# Altium footprint library SEMICONDUCTORS.PcbLib: 91 footprints (part 5 of 6) (continued)
## TFBGA-441 [mm] (continued)
3D body: height 0.37, standoff -0.03, extent 1.406,-7.396 1.805,-7.002
3D body: height 0.37, standoff -0.03, extent 1.407,-8.196 1.806,-7.802
3D body: height 0.37, standoff -0.03, extent 2.21,-8.996 2.609,-8.602
3D body: height 0.37, standoff -0.03, extent 2.206,-5.796 2.605,-5.402
3D body: height 0.37, standoff -0.03, extent 2.206,-6.596 2.605,-6.202
3D body: height 0.37, standoff -0.03, extent 2.206,-7.396 2.605,-7.002
3D body: height 0.37, standoff -0.03, extent 2.207,-8.196 2.606,-7.802
3D body: height 0.37, standoff -0.03, extent -4.999,-8.996 -4.6,-8.603
3D body: height 0.37, standoff -0.03, extent -5.003,-5.796 -4.604,-5.403
3D body: height 0.37, standoff -0.03, extent -5.003,-6.597 -4.603,-6.203
3D body: height 0.37, standoff -0.03, extent -5.003,-7.396 -4.604,-7.003
3D body: height 0.37, standoff -0.03, extent -5.002,-8.197 -4.603,-7.803
3D body: height 0.37, standoff -0.03, extent -4.199,-8.996 -3.8,-8.603
3D body: height 0.37, standoff -0.03, extent -4.203,-5.796 -3.804,-5.403
3D body: height 0.37, standoff -0.03, extent -4.203,-6.597 -3.803,-6.203
3D body: height 0.37, standoff -0.03, extent -4.203,-7.396 -3.804,-7.003
3D body: height 0.37, standoff -0.03, extent -4.202,-8.197 -3.803,-7.803
3D body: height 0.37, standoff -0.03, extent -3.399,-8.996 -3,-8.603
3D body: height 0.37, standoff -0.03, extent -3.403,-5.796 -3.004,-5.403
3D body: height 0.37, standoff -0.03, extent -3.403,-6.597 -3.003,-6.203
3D body: height 0.37, standoff -0.03, extent -3.403,-7.396 -3.004,-7.003
3D body: height 0.37, standoff -0.03, extent -3.402,-8.197 -3.003,-7.803
3D body: height 0.37, standoff -0.03, extent -2.599,-8.996 -2.2,-8.603
3D body: height 0.37, standoff -0.03, extent -2.603,-5.796 -2.204,-5.403
3D body: height 0.37, standoff -0.03, extent -2.603,-6.597 -2.203,-6.203
3D body: height 0.37, standoff -0.03, extent -2.603,-7.396 -2.204,-7.003
3D body: height 0.37, standoff -0.03, extent -2.602,-8.197 -2.203,-7.803
3D body: height 0.37, standoff -0.03, extent -1.799,-8.996 -1.4,-8.603
3D body: height 0.37, standoff -0.03, extent -1.803,-5.796 -1.404,-5.403
3D body: height 0.37, standoff -0.03, extent -1.803,-6.597 -1.403,-6.203
3D body: height 0.37, standoff -0.03, extent -1.803,-7.396 -1.404,-7.003
3D body: height 0.37, standoff -0.03, extent -1.802,-8.197 -1.403,-7.803
3D body: height 0.37, standoff -0.03, extent 5.41,-6.597 5.809,-6.203
3D body: height 0.37, standoff -0.03, extent 5.406,-3.397 5.805,-3.003
3D body: height 0.37, standoff -0.03, extent 5.406,-4.197 5.805,-3.803
3D body: height 0.37, standoff -0.03, extent 5.406,-4.997 5.805,-4.603
3D body: height 0.37, standoff -0.03, extent 5.407,-5.797 5.806,-5.403
3D body: height 0.37, standoff -0.03, extent 6.21,-6.597 6.609,-6.203
3D body: height 0.37, standoff -0.03, extent 6.206,-3.397 6.605,-3.003
3D body: height 0.37, standoff -0.03, extent 6.206,-4.197 6.605,-3.803
3D body: height 0.37, standoff -0.03, extent 6.206,-4.997 6.605,-4.603
3D body: height 0.37, standoff -0.03, extent 6.207,-5.797 6.606,-5.403
3D body: height 0.37, standoff -0.03, extent 7.01,-6.597 7.409,-6.203
3D body: height 0.37, standoff -0.03, extent 7.006,-3.397 7.405,-3.003
3D body: height 0.37, standoff -0.03, extent 7.006,-4.197 7.405,-3.803
3D body: height 0.37, standoff -0.03, extent 7.006,-4.997 7.405,-4.603
3D body: height 0.37, standoff -0.03, extent 7.007,-5.797 7.406,-5.403
3D body: height 0.37, standoff -0.03, extent 7.81,-6.597 8.209,-6.203
3D body: height 0.37, standoff -0.03, extent 7.806,-3.397 8.205,-3.003
3D body: height 0.37, standoff -0.03, extent 7.806,-4.197 8.205,-3.803
3D body: height 0.37, standoff -0.03, extent 7.806,-4.997 8.205,-4.603
3D body: height 0.37, standoff -0.03, extent 7.807,-5.797 8.206,-5.403
3D body: height 0.37, standoff -0.03, extent 8.61,-6.597 9.009,-6.203
3D body: height 0.37, standoff -0.03, extent 8.606,-3.397 9.005,-3.003
3D body: height 0.37, standoff -0.03, extent 8.606,-4.197 9.005,-3.803
3D body: height 0.37, standoff -0.03, extent 8.606,-4.997 9.005,-4.603
3D body: height 0.37, standoff -0.03, extent 8.607,-5.797 9.006,-5.403
3D body: height 0.37, standoff -0.03, extent 5.405,-2.597 5.804,-2.203
3D body: height 0.37, standoff -0.03, extent 5.401,0.603 5.8,0.997
3D body: height 0.37, standoff -0.03, extent 5.401,-0.197 5.801,0.197
3D body: height 0.37, standoff -0.03, extent 5.401,-0.997 5.8,-0.603
3D body: height 0.37, standoff -0.03, extent 5.402,-1.797 5.801,-1.403
3D body: height 0.37, standoff -0.03, extent 6.205,-2.597 6.604,-2.203
3D body: height 0.37, standoff -0.03, extent 6.201,0.603 6.6,0.997
3D body: height 0.37, standoff -0.03, extent 6.202,-0.197 6.601,0.197
3D body: height 0.37, standoff -0.03, extent 6.201,-0.997 6.6,-0.603
3D body: height 0.37, standoff -0.03, extent 6.202,-1.797 6.601,-1.403
3D body: height 0.37, standoff -0.03, extent 7.005,-2.597 7.404,-2.203
3D body: height 0.37, standoff -0.03, extent 7.001,0.603 7.4,0.997
3D body: height 0.37, standoff -0.03, extent 7.001,-0.197 7.401,0.197
3D body: height 0.37, standoff -0.03, extent 7.001,-0.997 7.4,-0.603
3D body: height 0.37, standoff -0.03, extent 7.002,-1.797 7.401,-1.403
3D body: height 0.37, standoff -0.03, extent 7.805,-2.597 8.204,-2.203
3D body: height 0.37, standoff -0.03, extent 7.801,0.603 8.2,0.997
3D body: height 0.37, standoff -0.03, extent 7.801,-0.197 8.201,0.197
3D body: height 0.37, standoff -0.03, extent 7.801,-0.997 8.2,-0.603
3D body: height 0.37, standoff -0.03, extent 7.802,-1.797 8.201,-1.403
3D body: height 0.37, standoff -0.03, extent 8.605,-2.597 9.004,-2.203
3D body: height 0.37, standoff -0.03, extent 8.601,0.603 9,0.997
3D body: height 0.37, standoff -0.03, extent 8.601,-0.197 9.001,0.197
3D body: height 0.37, standoff -0.03, extent 8.601,-0.997 9,-0.603
3D body: height 0.37, standoff -0.03, extent 8.602,-1.797 9.001,-1.403
3D body: height 0.37, standoff -0.03, extent 5.405,1.403 5.804,1.797
3D body: height 0.37, standoff -0.03, extent 5.401,4.603 5.8,4.997
3D body: height 0.37, standoff -0.03, extent 5.401,3.803 5.801,4.197
3D body: height 0.37, standoff -0.03, extent 5.401,3.003 5.8,3.397
3D body: height 0.37, standoff -0.03, extent 5.402,2.203 5.801,2.597
3D body: height 0.37, standoff -0.03, extent 6.205,1.403 6.604,1.797
3D body: height 0.37, standoff -0.03, extent 6.201,4.603 6.6,4.997
3D body: height 0.37, standoff -0.03, extent 6.202,3.803 6.601,4.197
3D body: height 0.37, standoff -0.03, extent 6.201,3.003 6.6,3.397
3D body: height 0.37, standoff -0.03, extent 6.202,2.203 6.601,2.597
3D body: height 0.37, standoff -0.03, extent 7.005,1.403 7.404,1.797
3D body: height 0.37, standoff -0.03, extent 7.001,4.603 7.4,4.997
3D body: height 0.37, standoff -0.03, extent 7.001,3.803 7.401,4.197
3D body: height 0.37, standoff -0.03, extent 7.001,3.003 7.4,3.397
3D body: height 0.37, standoff -0.03, extent 7.002,2.203 7.401,2.597
3D body: height 0.37, standoff -0.03, extent 7.805,1.403 8.204,1.797
3D body: height 0.37, standoff -0.03, extent 7.801,4.603 8.2,4.997
3D body: height 0.37, standoff -0.03, extent 7.801,3.803 8.201,4.197
3D body: height 0.37, standoff -0.03, extent 7.801,3.003 8.2,3.397
3D body: height 0.37, standoff -0.03, extent 7.802,2.203 8.201,2.597
3D body: height 0.37, standoff -0.03, extent 8.605,1.403 9.004,1.797
3D body: height 0.37, standoff -0.03, extent 8.601,4.603 9,4.997
3D body: height 0.37, standoff -0.03, extent 8.601,3.803 9.001,4.197
3D body: height 0.37, standoff -0.03, extent 8.601,3.003 9,3.397
3D body: height 0.37, standoff -0.03, extent 8.602,2.203 9.001,2.597
3D body: height 0.37, standoff -0.03, extent 3.005,5.403 3.404,5.797
3D body: height 0.37, standoff -0.03, extent 3.001,8.603 3.4,8.997
3D body: height 0.37, standoff -0.03, extent 3.002,7.803 3.401,8.197
3D body: height 0.37, standoff -0.03, extent 3.001,7.003 3.4,7.397
3D body: height 0.37, standoff -0.03, extent 3.002,6.203 3.401,6.597
3D body: height 0.37, standoff -0.03, extent 3.805,5.403 4.204,5.797
3D body: height 0.37, standoff -0.03, extent 3.801,8.603 4.2,8.997
3D body: height 0.37, standoff -0.03, extent 3.802,7.803 4.201,8.197
3D body: height 0.37, standoff -0.03, extent 3.801,7.003 4.2,7.397
3D body: height 0.37, standoff -0.03, extent 3.802,6.203 4.201,6.597
3D body: height 0.37, standoff -0.03, extent 4.605,5.403 5.004,5.797
3D body: height 0.37, standoff -0.03, extent 4.601,8.603 5,8.997
3D body: height 0.37, standoff -0.03, extent 4.602,7.803 5.001,8.197
3D body: height 0.37, standoff -0.03, extent 4.601,7.003 5,7.397
3D body: height 0.37, standoff -0.03, extent 4.602,6.203 5.001,6.597
3D body: height 0.37, standoff -0.03, extent 5.405,5.403 5.804,5.797
3D body: height 0.37, standoff -0.03, extent 5.401,8.603 5.8,8.997
3D body: height 0.37, standoff -0.03, extent 5.402,7.803 5.801,8.197
3D body: height 0.37, standoff -0.03, extent 5.401,7.003 5.8,7.397
3D body: height 0.37, standoff -0.03, extent 5.402,6.203 5.801,6.597
3D body: height 0.37, standoff -0.03, extent 6.205,5.403 6.604,5.797
3D body: height 0.37, standoff -0.03, extent 6.201,8.603 6.6,8.997
3D body: height 0.37, standoff -0.03, extent 6.202,7.803 6.601,8.197
3D body: height 0.37, standoff -0.03, extent 6.201,7.003 6.6,7.397
3D body: height 0.37, standoff -0.03, extent 6.202,6.203 6.601,6.597
3D body: height 0.37, standoff -0.03, extent -0.995,5.403 -0.596,5.797
3D body: height 0.37, standoff -0.03, extent -0.999,8.603 -0.6,8.997
3D body: height 0.37, standoff -0.03, extent -0.998,7.803 -0.599,8.197
3D body: height 0.37, standoff -0.03, extent -0.999,7.003 -0.6,7.397
3D body: height 0.37, standoff -0.03, extent -0.998,6.203 -0.599,6.597
3D body: height 0.37, standoff -0.03, extent -0.195,5.403 0.204,5.797
3D body: height 0.37, standoff -0.03, extent -0.199,8.603 0.2,8.997
3D body: height 0.37, standoff -0.03, extent -0.198,7.803 0.201,8.197
3D body: height 0.37, standoff -0.03, extent -0.199,7.003 0.2,7.397
3D body: height 0.37, standoff -0.03, extent -0.198,6.203 0.201,6.597
3D body: height 0.37, standoff -0.03, extent 0.605,5.403 1.004,5.797
3D body: height 0.37, standoff -0.03, extent 0.601,8.603 1,8.997
3D body: height 0.37, standoff -0.03, extent 0.602,7.803 1.001,8.197
3D body: height 0.37, standoff -0.03, extent 0.601,7.003 1,7.397
3D body: height 0.37, standoff -0.03, extent 0.602,6.203 1.001,6.597
3D body: height 0.37, standoff -0.03, extent 1.405,5.403 1.804,5.797
3D body: height 0.37, standoff -0.03, extent 1.401,8.603 1.8,8.997
3D body: height 0.37, standoff -0.03, extent 1.402,7.803 1.801,8.197
3D body: height 0.37, standoff -0.03, extent 1.401,7.003 1.8,7.397
3D body: height 0.37, standoff -0.03, extent 1.402,6.203 1.801,6.597
3D body: height 0.37, standoff -0.03, extent 2.205,5.403 2.604,5.797
3D body: height 0.37, standoff -0.03, extent 2.201,8.603 2.6,8.997
3D body: height 0.37, standoff -0.03, extent 2.202,7.803 2.601,8.197
3D body: height 0.37, standoff -0.03, extent 2.201,7.003 2.6,7.397
3D body: height 0.37, standoff -0.03, extent 2.202,6.203 2.601,6.597
3D body: height 0.37, standoff -0.03, extent -1.802,6.203 -1.403,6.597
3D body: height 0.37, standoff -0.03, extent -1.803,7.003 -1.404,7.397
3D body: height 0.37, standoff -0.03, extent -1.803,7.803 -1.403,8.197
3D body: height 0.37, standoff -0.03, extent -1.803,8.603 -1.404,8.997
3D body: height 0.37, standoff -0.03, extent -1.799,5.403 -1.4,5.797
3D body: height 0.37, standoff -0.03, extent -2.602,6.203 -2.203,6.597
3D body: height 0.37, standoff -0.03, extent -2.603,7.003 -2.204,7.397
3D body: height 0.37, standoff -0.03, extent -2.603,7.803 -2.203,8.197
3D body: height 0.37, standoff -0.03, extent -2.603,8.603 -2.204,8.997
3D body: height 0.37, standoff -0.03, extent -2.599,5.403 -2.2,5.797
3D body: height 0.37, standoff -0.03, extent -3.402,6.203 -3.003,6.597
3D body: height 0.37, standoff -0.03, extent -3.403,7.003 -3.004,7.397
3D body: height 0.37, standoff -0.03, extent -3.403,7.803 -3.003,8.197
3D body: height 0.37, standoff -0.03, extent -3.403,8.603 -3.004,8.997
3D body: height 0.37, standoff -0.03, extent -3.399,5.403 -3,5.797
3D body: height 0.37, standoff -0.03, extent -4.202,6.203 -3.803,6.597
3D body: height 0.37, standoff -0.03, extent -4.203,7.003 -3.804,7.397
3D body: height 0.37, standoff -0.03, extent -4.203,7.803 -3.803,8.197
3D body: height 0.37, standoff -0.03, extent -4.203,8.603 -3.804,8.997
3D body: height 0.37, standoff -0.03, extent -4.199,5.403 -3.8,5.797
3D body: height 0.37, standoff -0.03, extent -5.002,6.203 -4.603,6.597
3D body: height 0.37, standoff -0.03, extent -5.003,7.003 -4.604,7.397
3D body: height 0.37, standoff -0.03, extent -5.003,7.803 -4.603,8.197
3D body: height 0.37, standoff -0.03, extent -5.003,8.603 -4.604,8.997
3D body: height 0.37, standoff -0.03, extent -4.999,5.403 -4.6,5.797
3D body: height 0.37, standoff -0.03, extent -5.801,3.803 -5.401,4.197
3D body: height 0.37, standoff -0.03, extent -5.802,4.603 -5.403,4.997
3D body: height 0.37, standoff -0.03, extent -5.801,5.403 -5.402,5.797
3D body: height 0.37, standoff -0.03, extent -5.802,6.203 -5.403,6.597
3D body: height 0.37, standoff -0.03, extent -5.798,3.003 -5.399,3.397
3D body: height 0.37, standoff -0.03, extent -5.801,-0.197 -5.402,0.197
3D body: height 0.37, standoff -0.03, extent -5.802,0.603 -5.403,0.997
3D body: height 0.37, standoff -0.03, extent -5.802,1.403 -5.403,1.797
3D body: height 0.37, standoff -0.03, extent -5.802,2.203 -5.403,2.597
3D body: height 0.37, standoff -0.03, extent -5.798,-0.997 -5.399,-0.603
3D body: height 0.37, standoff -0.03, extent -5.777,-4.197 -5.378,-3.803
3D body: height 0.37, standoff -0.03, extent -5.778,-3.397 -5.379,-3.003
3D body: height 0.37, standoff -0.03, extent -5.778,-2.597 -5.378,-2.203
3D body: height 0.37, standoff -0.03, extent -5.778,-1.797 -5.379,-1.403
3D body: height 0.37, standoff -0.03, extent -5.774,-4.997 -5.375,-4.603
3D body: height 0.37, standoff -0.03, extent -5.802,-8.197 -5.403,-7.803
3D body: height 0.37, standoff -0.03, extent -5.803,-7.397 -5.404,-7.003
3D body: height 0.37, standoff -0.03, extent -5.802,-6.597 -5.403,-6.203
3D body: height 0.37, standoff -0.03, extent -5.803,-5.797 -5.404,-5.403
3D body: height 0.37, standoff -0.03, extent -5.799,-8.997 -5.4,-8.603
3D body: height 0.37, standoff -0.03, extent -7.394,-8.997 -6.995,-8.603
3D body: height 0.37, standoff -0.03, extent -8.194,-8.997 -7.795,-8.603
3D body: height 0.37, standoff -0.03, extent -8.994,-8.997 -8.595,-8.603
3D body: height 0.37, standoff -0.03, extent -6.594,-8.997 -6.195,-8.603
3D body: height 0.37, standoff -0.03, extent -7.395,-8.197 -6.996,-7.803
3D body: height 0.37, standoff -0.03, extent -8.195,-8.197 -7.796,-7.803
3D body: height 0.37, standoff -0.03, extent -8.995,-8.197 -8.596,-7.803
3D body: height 0.37, standoff -0.03, extent -6.595,-8.197 -6.196,-7.803
3D body: height 0.37, standoff -0.03, extent -7.399,-4.997 -7,-4.603
3D body: height 0.37, standoff -0.03, extent -8.199,-4.997 -7.8,-4.603
3D body: height 0.37, standoff -0.03, extent -8.999,-4.997 -8.6,-4.603
3D body: height 0.37, standoff -0.03, extent -6.599,-4.997 -6.2,-4.603
3D body: height 0.37, standoff -0.03, extent -6.598,-5.797 -6.199,-5.403
3D body: height 0.37, standoff -0.03, extent -8.998,-5.797 -8.599,-5.403
3D body: height 0.37, standoff -0.03, extent -8.198,-5.797 -7.799,-5.403
3D body: height 0.37, standoff -0.03, extent -7.399,-5.797 -6.999,-5.403
3D body: height 0.37, standoff -0.03, extent -6.599,-6.597 -6.2,-6.203
3D body: height 0.37, standoff -0.03, extent -8.999,-6.597 -8.6,-6.203
3D body: height 0.37, standoff -0.03, extent -8.199,-6.597 -7.8,-6.203
3D body: height 0.37, standoff -0.03, extent -7.399,-6.597 -7,-6.203
3D body: height 0.37, standoff -0.03, extent -6.598,-7.397 -6.199,-7.003
3D body: height 0.37, standoff -0.03, extent -8.998,-7.397 -8.599,-7.003
3D body: height 0.37, standoff -0.03, extent -8.198,-7.397 -7.799,-7.003
3D body: height 0.37, standoff -0.03, extent -7.398,-7.397 -6.999,-7.003
3D body: height 0.37, standoff -0.03, extent -7.399,-1.797 -7,-1.403
3D body: height 0.37, standoff -0.03, extent -8.199,-1.797 -7.8,-1.403
3D body: height 0.37, standoff -0.03, extent -8.999,-1.797 -8.6,-1.403
3D body: height 0.37, standoff -0.03, extent -6.599,-1.797 -6.2,-1.403
3D body: height 0.37, standoff -0.03, extent -6.598,-2.597 -6.199,-2.203
3D body: height 0.37, standoff -0.03, extent -8.998,-2.597 -8.599,-2.203
3D body: height 0.37, standoff -0.03, extent -8.198,-2.597 -7.799,-2.203
3D body: height 0.37, standoff -0.03, extent -7.399,-2.597 -6.999,-2.203
3D body: height 0.37, standoff -0.03, extent -6.599,-3.397 -6.2,-3.003
3D body: height 0.37, standoff -0.03, extent -8.999,-3.397 -8.6,-3.003
3D body: height 0.37, standoff -0.03, extent -8.199,-3.397 -7.8,-3.003
3D body: height 0.37, standoff -0.03, extent -7.399,-3.397 -7,-3.003
3D body: height 0.37, standoff -0.03, extent -6.598,-4.197 -6.199,-3.803
3D body: height 0.37, standoff -0.03, extent -8.998,-4.197 -8.599,-3.803
3D body: height 0.37, standoff -0.03, extent -8.198,-4.197 -7.799,-3.803
3D body: height 0.37, standoff -0.03, extent -7.398,-4.197 -6.999,-3.803
3D body: height 0.37, standoff -0.03, extent -7.399,1.403 -7,1.797
3D body: height 0.37, standoff -0.03, extent -8.199,1.403 -7.8,1.797
3D body: height 0.37, standoff -0.03, extent -8.999,1.403 -8.6,1.797
3D body: height 0.37, standoff -0.03, extent -6.599,1.403 -6.2,1.797
3D body: height 0.37, standoff -0.03, extent -6.598,0.603 -6.199,0.997
3D body: height 0.37, standoff -0.03, extent -8.998,0.603 -8.599,0.997
3D body: height 0.37, standoff -0.03, extent -8.198,0.603 -7.799,0.997
3D body: height 0.37, standoff -0.03, extent -7.399,0.603 -6.999,0.997
3D body: height 0.37, standoff -0.03, extent -6.599,-0.197 -6.2,0.197
3D body: height 0.37, standoff -0.03, extent -8.999,-0.197 -8.6,0.197
3D body: height 0.37, standoff -0.03, extent -8.199,-0.197 -7.8,0.197
3D body: height 0.37, standoff -0.03, extent -7.399,-0.197 -7,0.197
3D body: height 0.37, standoff -0.03, extent -6.598,-0.997 -6.199,-0.603
3D body: height 0.37, standoff -0.03, extent -8.998,-0.997 -8.599,-0.603
3D body: height 0.37, standoff -0.03, extent -8.198,-0.997 -7.799,-0.603
3D body: height 0.37, standoff -0.03, extent -7.398,-0.997 -6.999,-0.603
3D body: height 0.37, standoff -0.03, extent -7.397,4.603 -6.997,4.997
3D body: height 0.37, standoff -0.03, extent -8.197,4.603 -7.797,4.997
3D body: height 0.37, standoff -0.03, extent -8.997,4.603 -8.597,4.997
3D body: height 0.37, standoff -0.03, extent -6.597,4.603 -6.197,4.997
3D body: height 0.37, standoff -0.03, extent -6.596,3.803 -6.197,4.197
3D body: height 0.37, standoff -0.03, extent -8.996,3.803 -8.597,4.197
3D body: height 0.37, standoff -0.03, extent -8.196,3.803 -7.797,4.197
3D body: height 0.37, standoff -0.03, extent -7.396,3.803 -6.997,4.197
3D body: height 0.37, standoff -0.03, extent -6.597,3.003 -6.197,3.397
3D body: height 0.37, standoff -0.03, extent -8.997,3.003 -8.597,3.397
3D body: height 0.37, standoff -0.03, extent -8.197,3.003 -7.797,3.397
3D body: height 0.37, standoff -0.03, extent -7.397,3.003 -6.997,3.397
3D body: height 0.37, standoff -0.03, extent -6.596,2.203 -6.196,2.597
3D body: height 0.37, standoff -0.03, extent -8.996,2.203 -8.596,2.597
3D body: height 0.37, standoff -0.03, extent -8.196,2.203 -7.796,2.597
3D body: height 0.37, standoff -0.03, extent -7.396,2.203 -6.996,2.597
3D body: height 0.37, standoff -0.03, extent -7.397,5.403 -6.998,5.797
3D body: height 0.37, standoff -0.03, extent -8.197,5.403 -7.798,5.797
3D body: height 0.37, standoff -0.03, extent -8.997,5.403 -8.598,5.797
3D body: height 0.37, standoff -0.03, extent -6.597,5.403 -6.198,5.797
3D body: height 0.37, standoff -0.03, extent -7.398,6.203 -6.999,6.597
3D body: height 0.37, standoff -0.03, extent -8.198,6.203 -7.799,6.597
3D body: height 0.37, standoff -0.03, extent -8.998,6.203 -8.599,6.597
3D body: height 0.37, standoff -0.03, extent -6.598,6.203 -6.199,6.597
3D body: height 0.37, standoff -0.03, extent -7.399,7.003 -7,7.397
3D body: height 0.37, standoff -0.03, extent -8.199,7.003 -7.8,7.397
3D body: height 0.37, standoff -0.03, extent -8.999,7.003 -8.6,7.397
3D body: height 0.37, standoff -0.03, extent -6.599,7.003 -6.2,7.397
3D body: height 0.37, standoff -0.03, extent -7.399,7.803 -6.999,8.197
3D body: height 0.37, standoff -0.03, extent -8.198,7.803 -7.799,8.197
3D body: height 0.37, standoff -0.03, extent -8.999,7.803 -8.599,8.197
3D body: height 0.37, standoff -0.03, extent -6.598,7.803 -6.199,8.197
3D body: height 0.37, standoff -0.03, extent -6.599,8.603 -6.2,8.997
3D body: height 0.37, standoff -0.03, extent -8.999,8.603 -8.6,8.997
3D body: height 0.37, standoff -0.03, extent -8.199,8.603 -7.8,8.997
3D body: height 0.37, standoff -0.03, extent -7.399,8.603 -7,8.997
3D body: height 1.4, standoff 0.2, extent -9.5,-9.537 9.5,9.537

## TFSOP-38 [mm]
pads (39):
  rect 1.475x0.3 smd: 1(-2.938,4.5) 2(-2.938,4) 3(-2.938,3.5) 4(-2.938,3) 5(-2.938,2.5) 6(-2.938,2) 7(-2.938,1.5) 8(-2.938,1) 9(-2.938,0.5) 10(-2.938,0) 11(-2.938,-0.5) 12(-2.938,-1) 13(-2.938,-1.5) 14(-2.938,-2) 15(-2.938,-2.5) 16(-2.938,-3) 17(-2.938,-3.5) 18(-2.938,-4) 19(-2.938,-4.5) 20(2.938,-4.5) 21(2.938,-4) 22(2.938,-3.5) 23(2.938,-3) 24(2.938,-2.5) 25(2.938,-2) 26(2.938,-1.5) 27(2.938,-1) 28(2.938,-0.5) 29(2.938,0) 30(2.938,0.5) 31(2.938,1) 32(2.938,1.5) 33(2.938,2) 34(2.938,2.5) 35(2.938,3) 36(2.938,3.5) 37(2.938,4) 38(2.938,4.5)
  rect 2.9x4.7 smd: 39(0,0)
Top Overlay:
  lines w0.15: -3.861,-4.423 -3.861,-4.848 3.861,-4.848 3.861,-4.423 ; -3.861,4.426 -3.861,4.851 3.861,4.851 3.861,4.426
  lines w0.5: -4.267,4.623 -4.267,4.623
Top Assembly:
  lines w0.127: -3.861,-4.851 3.861,-4.851 3.861,4.85 -3.861,4.85 -3.861,-4.851
  text ".Designator" at 0.381,-2.388 h1.2
Top Component Center:
  lines w0.15: -1,0 1,0 ; 0,-1 0,1
3D body "LP8866QDCPRQ1.STEP": height 1.18, standoff -0.02, extent -3.2,-4.85 3.2,4.85

## TO-227-3 [mm]
pads (3):
  rect 1.2x1.5 smd: 1(-2.75,0.985) 2(-2.75,-0.985)
  rect 4.65x4.15 smd: 3(1,0)
Top Overlay:
  lines w0.127: -3.556,-2.286 -3.556,2.286 3.556,2.286 3.556,-2.286 -3.556,-2.286
Top Assembly:
  lines w0.127: -3.556,-2.286 -3.556,2.286 3.556,2.286 3.556,-2.286 -3.556,-2.286
  text ".Designator" at -2.591,-0.432 h1
Top Component Center:
  lines w0.127: -0.5,0 0.5,0 ; 0,-0.5 0,0.5
3D body "FSV12100V.STEP": height 1.19, standoff -0.01, extent -3.25,-2.22 3.25,2.22

## TSSOP-8 [mm]
pads (8):
  rect 0.89x0.42 smd: 1(-2.1,0.975) 2(-2.1,0.325) 3(-2.1,-0.325) 4(-2.1,-0.975) 5(2.1,-0.975) 6(2.1,-0.325) 7(2.1,0.325) 8(2.1,0.975)
Top Overlay:
  circle w0.254: c-1.9,1.65 r0.056
  lines w0.127: -1.5,-1.5 1.5,-1.5 ; -1.5,1.5 1.5,1.5
Top Assembly:
  lines w0.127: 1.475,-1.5 1.5,-1.475 1.5,1.5 -1.5,1.5 -1.5,-1.5 1.5,-1.5
  text ".Designator" at -1.25,-0.45 h1
Top Component Center:
  lines w0.127: -0.5,0 0.5,0 ; 0,-0.5 0,0.5
3D body "TSSOP-8.STEP": height 1.1, standoff 0, extent -2.45,-1.5 2.45,1.5

## TSSOP-14 [mm]
pads (14):
  rect 1.65x0.3 smd paste-0.025: 1(-2.775,1.95) 2(-2.775,1.3) 3(-2.775,0.65) 4(-2.775,0) 5(-2.775,-0.65) 6(-2.775,-1.3) 7(-2.775,-1.95) 8(2.775,-1.95) 9(2.775,-1.3) 10(2.775,-0.65) 11(2.775,0) 12(2.775,0.65) 13(2.775,1.3) 14(2.775,1.95)
Top Overlay:
  lines w0.15: -2,-2.3 -2,-2.55 2,-2.55 2,-2.3 ; -2,2.3 -2,2.55 -0.517,2.55 ccw(c0,2.55) 0.517,2.55 2,2.55 2,2.3
  lines w0.5: -2.725,2.6 -2.725,2.6
Top Assembly:
  lines w0.127: -3.775,-2.55 3.775,-2.55 3.775,2.575 2.975,2.575 -3.775,2.575 -3.775,2.25 -3.775,-2.55
  text ".Designator" at 0.475,-2 h1.2
Top Component Center:
  lines w0.127: -1,0 1,0 ; 0,-1 0,1
3D body "TSSOP-14.STEP": height 1.2, standoff 0, extent -3.2,-2.5 3.2,2.5

## TSSOP-16 [mm]
pads (16):
  rect 1.65x0.3 smd: 1(-2.775,2.275) 2(-2.775,1.625) 3(-2.775,0.975) 4(-2.775,0.325) 5(-2.775,-0.325) 6(-2.775,-0.975) 7(-2.775,-1.625) 8(-2.775,-2.275) 9(2.775,-2.275) 10(2.775,-1.625) 11(2.775,-0.975) 12(2.775,-0.325) 13(2.775,0.325) 14(2.775,0.975) 15(2.775,1.625) 16(2.775,2.275)
Top Overlay:
  lines w0.15: -2.2,-2.625 -2.2,-2.725 2.2,-2.725 2.2,-2.625 ; -2.2,2.625 -2.2,2.725 -0.517,2.725 ccw(c0,2.725) 0.517,2.725 2.2,2.725 2.2,2.625
  lines w0.5: -2.625,3 -2.625,3
Top Assembly:
  lines w0.127: -3.8,-2.65 -3.8,2.675 3.8,2.675 3.8,-2.65 -3.8,-2.65
  text ".Designator" at 0.5,-1.75 h1.2
Top Component Center:
  lines w0.127: -1,0 1,0 ; 0,-1 0,1
3D body "TSSOP-16.STEP": height 1.2, standoff 0, extent -3.2,-2.5 3.2,2.5

## TSSOP-20 [mm]
pads (20):
  rect 1.65x0.3 smd: 1(-2.775,2.925) 2(-2.775,2.275) 3(-2.775,1.625) 4(-2.775,0.975) 5(-2.775,0.325) 6(-2.775,-0.325) 7(-2.775,-0.975) 8(-2.775,-1.625) 9(-2.775,-2.275) 10(-2.775,-2.925) 11(2.775,-2.925) 12(2.775,-2.275) 13(2.775,-1.625) 14(2.775,-0.975) 15(2.775,-0.325) 16(2.775,0.325) 17(2.775,0.975) 18(2.775,1.625) 19(2.775,2.275) 20(2.775,2.925)
Top Overlay:
  lines w0.127: -2.2,-3.248 -2.2,-3.375 2.2,-3.375 2.2,-3.248 ; -2.2,3.248 -2.2,3.375 -0.517,3.375 ccw(c0,3.375) 0.517,3.375 2.2,3.375 2.2,3.248
  lines w0.5: -2.775,3.525 -2.775,3.525
Top Assembly:
  lines w0.127: -3.8,-3.375 3.775,-3.375 3.775,3.375 -3.8,3.375 -3.8,-3.375
  text ".Designator" at 0.8,-2.2 h1.8
Top Component Center:
  lines w0.127: -1,0 1,0 ; 0,-1 0,1
3D body "TSSOP-20.STEP": height 1.2, standoff 0, extent -3.2,-3.25 3.2,3.25

## TSSOP-28 [mm]
pads (28):
  rect 1.5x0.3 smd: 1(-2.95,4.225) 2(-2.95,3.575) 3(-2.95,2.925) 4(-2.95,2.275) 5(-2.95,1.625) 6(-2.95,0.975) 7(-2.95,0.325) 8(-2.95,-0.325) 9(-2.95,-0.975) 10(-2.95,-1.625) 11(-2.95,-2.275) 12(-2.95,-2.925) 13(-2.95,-3.575) 14(-2.95,-4.225) 15(2.95,-4.225) 16(2.95,-3.575) 17(2.95,-2.925) 18(2.95,-2.275) 19(2.95,-1.625) 20(2.95,-0.975) 21(2.95,-0.325) 22(2.95,0.325) 23(2.95,0.975) 24(2.95,1.625) 25(2.95,2.275) 26(2.95,2.925) 27(2.95,3.575) 28(2.95,4.225)
Top Overlay:
  lines w0.127: -3.825,-4.9 3.9,-4.9 3.9,4.929 -3.825,4.929 -3.825,-4.575 -3.825,-4.9
  lines w0.15: -2.2,-4.625 -2.2,-4.9 2.2,-4.9 2.2,-4.625 ; -2.2,4.6 -2.2,4.929 ; -2.2,4.93 -0.3,4.925 ccw(c0,4.925) 0.3,4.929 2.2,4.934 ; 2.2,4.604 2.2,4.933
  lines w0.5: -2.725,5.075 -2.725,5.075
Top Assembly:
  text ".Designator" at 0.7,-3.725 h2
Top Component Center:
  lines w0.127: -1,0 1,0 ; 0,-1 0,1
3D body "TSSOP-28.STEP": height 1.2, standoff 0, extent -3.2,-4.85 3.2,4.85